# Altium footprint library Connectors.PcbLib: 164 footprints (part 3 of 11)
Each footprint in its own frame and in the unit in brackets; x right, y up, seen from the top. Pads: shape width x height; smd on the part's side, far side on the other; paste and mask are expansions set on the pad; w line width, h text height; cw(c..) or ccw(c..) is an arc to the next point about the centre after c.
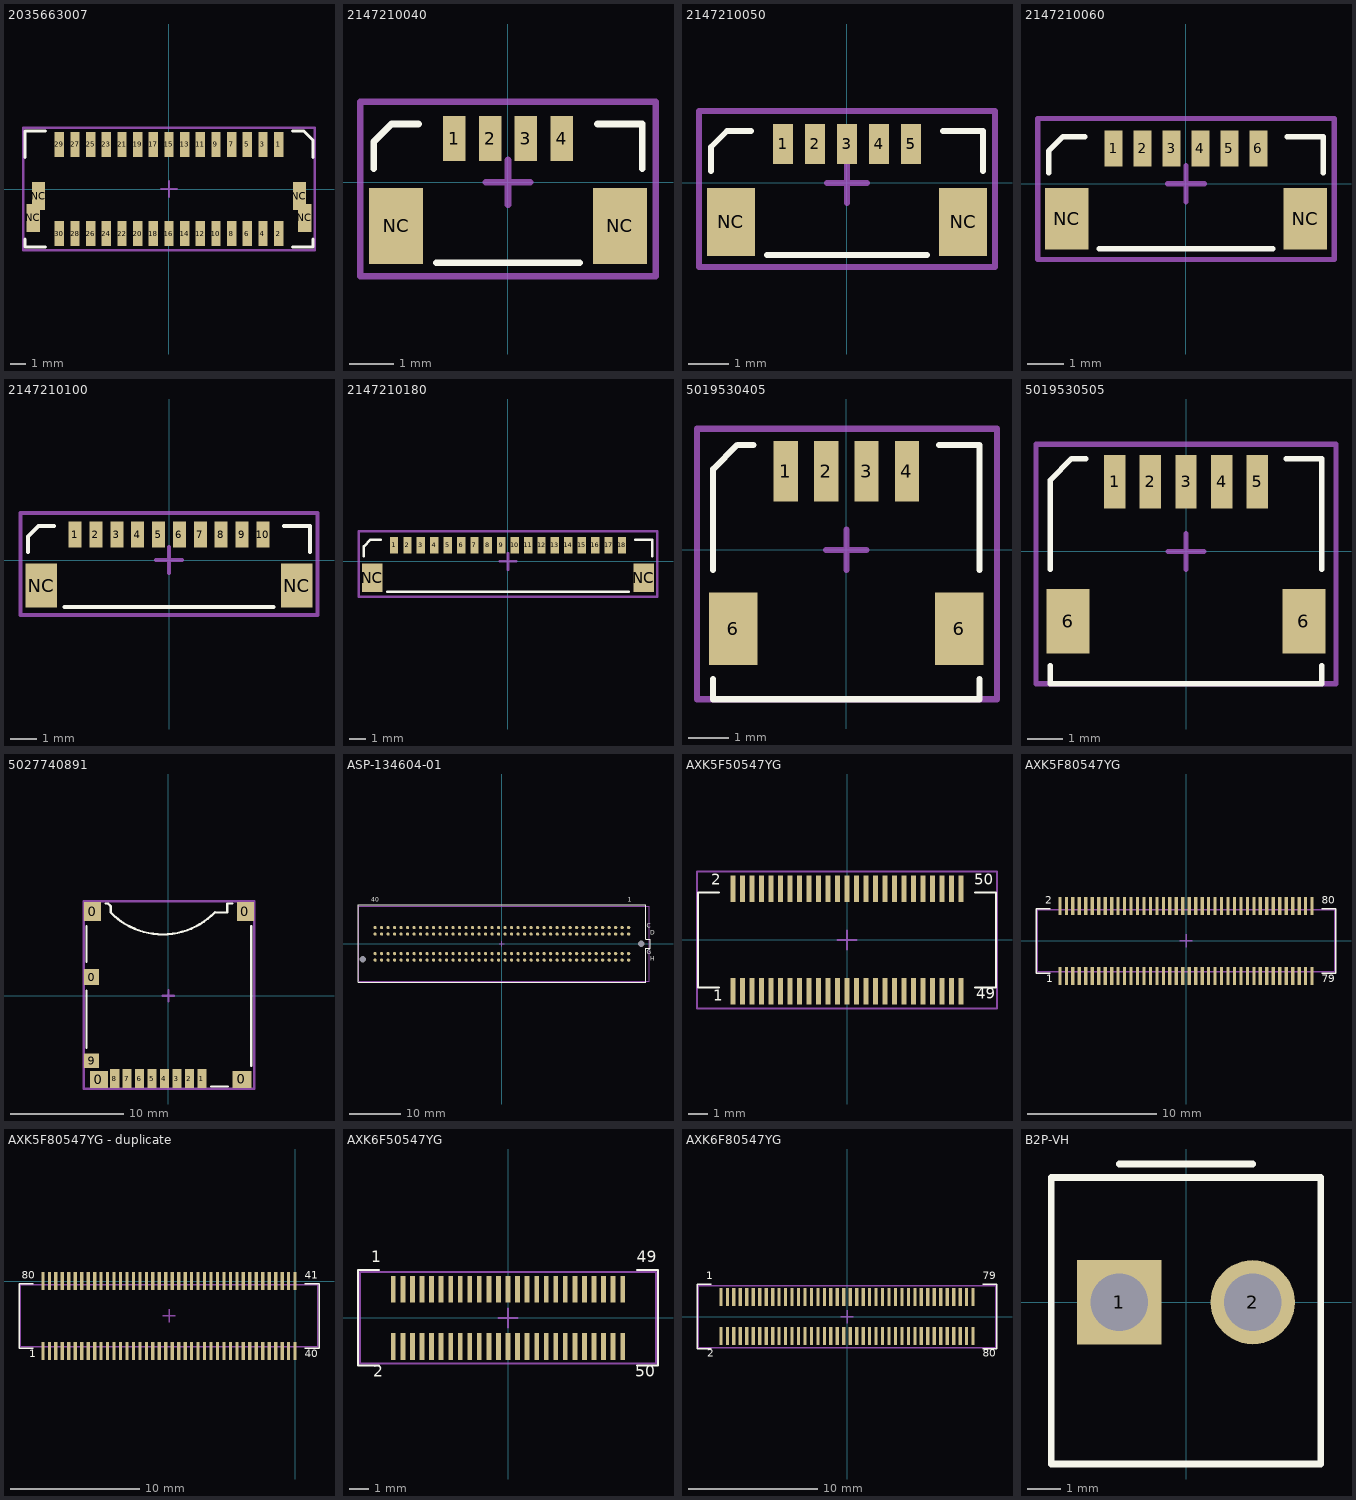
[diagram p2: the footprints below, top view; thin cyan lines are the x and y axes]

## 2035663007 [mm]
pads (34):
  rect 0.6x1.6 smd: 1(7,2.85) 2(7,-2.85) 3(6,2.85) 4(6,-2.85) 5(5,2.85) 6(5,-2.85) 7(4,2.85) 8(4,-2.85) 9(3,2.85) 10(3,-2.85) 11(2,2.85) 12(2,-2.85) 13(1,2.85) 14(1,-2.85) 15(0,2.85) 16(0,-2.85) 17(-1,2.85) 18(-1,-2.85) 19(-2,2.85) 20(-2,-2.85) 21(-3,2.85) 22(-3,-2.85) 23(-4,2.85) 24(-4,-2.85) 25(-5,2.85) 26(-5,-2.85) 27(-6,2.85) 28(-6,-2.85) 29(-7,2.85) 30(-7,-2.85)
  rect 0.85x1.8 smd: NC(-8.675,-1.85) NC(-8.325,-0.45) NC(8.325,-0.45) NC(8.675,-1.85)
Top Overlay:
  lines w0.2: -9.2,-3.2 -9.2,-3.7 -7.9,-3.7 ; -9.2,2 -9.2,3.7 -7.9,3.7 ; 7.9,-3.7 9.2,-3.7 9.2,-3.2 ; 7.9,3.7 8.6,3.7 9.2,3.1 9.2,2
Mechanical 15:
  lines w0.15: -0.5,0 0.5,0 ; 0,-0.5 0,0.5 ; -9.3,-3.9 9.3,-3.9 9.3,3.9 -9.3,3.9 -9.3,-3.9
3D body "2035663007.stp": height 8.23, standoff -0.03, extent -9,-3 9,3.5

## 2147210040 [mm]
height 1.6
pads (6):
  rect 0.5x1 smd: 1(-1.2,0.975) 2(-0.4,0.975) 3(0.4,0.975) 4(1.2,0.975)
  rect 1.2x1.7 smd: NC(-2.5,-0.975) NC(2.5,-0.975)
Top Overlay:
  lines w0.15: -3,0.3 -3,0.9 -2.6,1.3 -2,1.3 ; -1.6,-1.8 1.6,-1.8 ; 2,1.3 3,1.3 3,0.3
Mechanical 13:
  lines w0.15: -0.5,0 0.5,0 ; 0,-0.5 0,0.5 ; -3.3,-2.1 -3.3,1.8 3.3,1.8 3.3,-2.1 -3.3,-2.1
3D body "2147210040.stp": height 1.6, standoff 0, extent -2.74,-1.5 2.74,1

## 2147210050 [mm]
height 1.6
pads (7):
  rect 0.5x1 smd: 1(-1.6,0.975) 2(-0.8,0.975) 3(0,0.975) 4(0.8,0.975) 5(1.6,0.975)
  rect 1.2x1.7 smd: NC(-2.9,-0.975) NC(2.9,-0.975)
Top Overlay:
  lines w0.15: -3.4,0.3 -3.4,0.9 -3,1.3 -2.4,1.3 ; -2,-1.8 2,-1.8 ; 2.4,1.3 3.4,1.3 3.4,0.3
Mechanical 13:
  lines w0.15: -0.5,0 0.5,0 ; 0,-0.5 0,0.5 ; -3.7,-2.1 -3.7,1.8 3.7,1.8 3.7,-2.1 -3.7,-2.1
3D body "2147210050.stp": height 1.55, standoff -0.05, extent -3.14,-1.5 3.14,1

## 2147210060 [mm]
height 1.6
pads (8):
  rect 0.5x1 smd: 1(-2,0.975) 2(-1.2,0.975) 3(-0.4,0.975) 4(0.4,0.975) 5(1.2,0.975) 6(2,0.975)
  rect 1.2x1.7 smd: NC(-3.3,-0.975) NC(3.3,-0.975)
Top Overlay:
  lines w0.15: -3.8,0.3 -3.8,0.9 -3.4,1.3 -2.8,1.3 ; -2.4,-1.8 2.4,-1.8 ; 2.8,1.3 3.8,1.3 3.8,0.3
Mechanical 13:
  lines w0.15: -0.5,0 0.5,0 ; 0,-0.5 0,0.5 ; -4.1,-2.1 -4.1,1.8 4.1,1.8 4.1,-2.1 -4.1,-2.1
3D body "2147210060.stp": height 1.6, standoff 0, extent -3.54,-1.5 3.54,1

## 2147210100 [mm]
height 1.6
pads (12):
  rect 0.5x1 smd: 1(-3.6,0.975) 2(-2.8,0.975) 3(-2,0.975) 4(-1.2,0.975) 5(-0.4,0.975) 6(0.4,0.975) 7(1.2,0.975) 8(2,0.975) 9(2.8,0.975) 10(3.6,0.975)
  rect 1.2x1.7 smd: NC(-4.9,-0.975) NC(4.9,-0.975)
Top Overlay:
  lines w0.15: -5.4,0.3 -5.4,0.9 -5,1.3 -4.4,1.3 ; -4,-1.8 4,-1.8 ; 4.4,1.3 5.4,1.3 5.4,0.3
Mechanical 13:
  lines w0.15: -0.5,0 0.5,0 ; 0,-0.5 0,0.5 ; -5.7,-2.1 5.7,-2.1 5.7,1.8 -5.7,1.8 -5.7,-2.1
3D body "2147210100.stp": height 1.6, standoff 0, extent -5.14,-1.5 5.14,1

## 2147210180 [mm]
height 1.6
pads (20):
  rect 0.5x1 smd: 1(-6.8,0.975) 2(-6,0.975) 3(-5.2,0.975) 4(-4.4,0.975) 5(-3.6,0.975) 6(-2.8,0.975) 7(-2,0.975) 8(-1.2,0.975) 9(-0.4,0.975) 10(0.4,0.975) 11(1.2,0.975) 12(2,0.975) 13(2.8,0.975) 14(3.6,0.975) 15(4.4,0.975) 16(5.2,0.975) 17(6,0.975) 18(6.8,0.975)
  rect 1.2x1.7 smd: NC(-8.1,-0.975) NC(8.1,-0.975)
Top Overlay:
  lines w0.15: -8.6,0.3 -8.6,0.9 -8.2,1.3 -7.6,1.3 ; -7.2,-1.8 7.2,-1.8 ; 7.6,1.3 8.6,1.3 8.6,0.3
Mechanical 13:
  lines w0.15: -0.5,0 0.5,0 ; 0,-0.5 0,0.5 ; -8.9,-2.1 8.9,-2.1 8.9,1.8 -8.9,1.8 -8.9,-2.1
3D body "2147210180.stp": height 1.6, standoff 0, extent -8.34,-1.5 8.34,1

## 5019530405 [mm]
pads (6):
  rect 0.6x1.5 smd: 1(-1.5,1.95) 2(-0.5,1.95) 3(0.5,1.95) 4(1.5,1.95)
  rect 1.2x1.8 smd: 6(-2.8,-1.95) 6(2.8,-1.95)
Top Overlay:
  lines w0.15: -3.3,-3.2 -3.3,-3.7 3.3,-3.7 3.3,-3.2 ; -3.3,-0.5 -3.3,2 -2.7,2.6 -2.3,2.6 ; 2.3,2.6 3.3,2.6 3.3,-0.5
Mechanical 15:
  lines w0.15: -0.5,0 0.5,0 ; 0,-0.5 0,0.5 ; -3.7,-3.7 3.73,-3.7 3.73,3 -3.7,3 -3.7,-3.7
3D body "5019530405.stp": height 4.7, standoff 0, extent -3,-3.5 3,2.4

## 5019530505 [mm]
pads (7):
  rect 0.6x1.5 smd: 1(-2,1.95) 2(-1,1.95) 3(0,1.95) 4(1,1.95) 5(2,1.95)
  rect 1.2x1.8 smd: 6(-3.3,-1.95) 6(3.3,-1.95)
Top Overlay:
  lines w0.15: -3.8,-3.2 -3.8,-3.7 3.8,-3.7 3.8,-3.2 ; -3.8,-0.5 -3.8,2 -3.2,2.6 -2.8,2.6 ; 2.8,2.6 3.8,2.6 3.8,-0.5
Mechanical 15:
  lines w0.15: -0.5,0 0.5,0 ; 0,-0.5 0,0.5 ; -4.2,-3.7 4.2,-3.7 4.2,3 -4.2,3 -4.2,-3.7
3D body "5019530505.stp": height 4.7, standoff 0, extent -3.5,-3.5 3.5,2.4

## 5027740891 [mm]
pads (14):
  rect 1.29x1.4 smd: 0(-6.802,1.639)
  rect 1.5x1.7 smd: 0(-6.697,7.439) 0(6.803,7.439)
  rect 1.6x1.5 smd: 0(-6.147,-7.438)
  rect 1.7x1.5 smd: 0(6.503,-7.411)
  rect 0.8x1.68 smd: 1(2.953,-7.353) 2(1.853,-7.353) 3(0.753,-7.353) 4(-0.347,-7.353) 5(-1.447,-7.353) 6(-2.547,-7.353) 7(-3.647,-7.353) 8(-4.747,-7.353)
  rect 1.29x1.3 smd: 9(-6.802,-5.761)
Top Overlay:
  lines w0.2: -7.25,-4.6 -7.25,0.45 ; -7.25,3 -7.25,6.15 ; -5.55,8.15 -5.35,8.15 -5.2,8 -5.1,7.9 -5.1,7.35 ccw(c-0.5,11.85) 4.124,7.375 ; 3.8,-8.05 5.25,-8.05 ; 4.15,7.35 5.2,7.35 5.2,8.15 5.65,8.15 ; 7.33,-6.208 7.33,6.15
Mechanical 15:
  lines w0.2: -0.5,0 0.5,0 ; 0,-0.5 0,0.5 ; -7.5,-8.25 7.35,-8.25 7.6,-8.25 7.6,8.35 -7.5,8.35 -7.5,-8.25
3D body "5027740891.stp": height 1.78, standoff -0.02, extent -7.102,-7.968 7.198,8.032

## ASP-134604-01 [mm]
pads (162):
  round 0.64 smd: C1(24.765,3.175) C2(23.495,3.175) C3(22.225,3.175) C4(20.955,3.175) C5(19.685,3.175) C6(18.415,3.175) C7(17.145,3.175) C8(15.875,3.175) C9(14.605,3.175) C10(13.335,3.175) C11(12.065,3.175) C12(10.795,3.175) C13(9.525,3.175) C14(8.255,3.175) C15(6.985,3.175) C16(5.715,3.175) C17(4.445,3.175) C18(3.175,3.175) C19(1.905,3.175) C20(0.635,3.175) C21(-0.635,3.175) C22(-1.905,3.175) C23(-3.175,3.175) C24(-4.445,3.175) C25(-5.715,3.175) C26(-6.985,3.175) C27(-8.255,3.175) C28(-9.525,3.175) C29(-10.795,3.175) C30(-12.065,3.175) C31(-13.335,3.175) C32(-14.605,3.175) C33(-15.875,3.175) C34(-17.145,3.175) C35(-18.415,3.175) C36(-19.685,3.175) C37(-20.955,3.175) C38(-22.225,3.175) C39(-23.495,3.175) C40(-24.765,3.175) D1(24.765,1.905) D2(23.495,1.905) D3(22.225,1.905) D4(20.955,1.905) D5(19.685,1.905) D6(18.415,1.905) D7(17.145,1.905) D8(15.875,1.905) D9(14.605,1.905) D10(13.335,1.905) D11(12.065,1.905) D12(10.795,1.905) D13(9.525,1.905) D14(8.255,1.905) D15(6.985,1.905) D16(5.715,1.905) D17(4.445,1.905) D18(3.175,1.905) D19(1.905,1.905) D20(0.635,1.905) D21(-0.635,1.905) D22(-1.905,1.905) D23(-3.175,1.905) D24(-4.445,1.905) D25(-5.715,1.905) D26(-6.985,1.905) D27(-8.255,1.905) D28(-9.525,1.905) D29(-10.795,1.905) D30(-12.065,1.905) D31(-13.335,1.905) D32(-14.605,1.905) D33(-15.875,1.905) D34(-17.145,1.905) D35(-18.415,1.905) D36(-19.685,1.905) D37(-20.955,1.905) D38(-22.225,1.905) D39(-23.495,1.905) D40(-24.765,1.905) G1(24.765,-1.905) G2(23.495,-1.905) G3(22.225,-1.905) G4(20.955,-1.905) G5(19.685,-1.905) G6(18.415,-1.905) G7(17.145,-1.905) G8(15.875,-1.905) G9(14.605,-1.905) G10(13.335,-1.905) G11(12.065,-1.905) G12(10.795,-1.905) G13(9.525,-1.905) G14(8.255,-1.905) G15(6.985,-1.905) G16(5.715,-1.905) G17(4.445,-1.905) G18(3.175,-1.905) G19(1.905,-1.905) G20(0.635,-1.905) G21(-0.635,-1.905) G22(-1.905,-1.905) G23(-3.175,-1.905) G24(-4.445,-1.905) G25(-5.715,-1.905) G26(-6.985,-1.905) G27(-8.255,-1.905) G28(-9.525,-1.905) G29(-10.795,-1.905) G30(-12.065,-1.905) G31(-13.335,-1.905) G32(-14.605,-1.905) G33(-15.875,-1.905) G34(-17.145,-1.905) G35(-18.415,-1.905) G36(-19.685,-1.905) G37(-20.955,-1.905) G38(-22.225,-1.905) G39(-23.495,-1.905) G40(-24.765,-1.905) H1(24.765,-3.175) H2(23.495,-3.175) H3(22.225,-3.175) H4(20.955,-3.175) H5(19.685,-3.175) H6(18.415,-3.175) H7(17.145,-3.175) H8(15.875,-3.175) H9(14.605,-3.175) H10(13.335,-3.175) H11(12.065,-3.175) H12(10.795,-3.175) H13(9.525,-3.175) H14(8.255,-3.175) H15(6.985,-3.175) H16(5.715,-3.175) H17(4.445,-3.175) H18(3.175,-3.175) H19(1.905,-3.175) H20(0.635,-3.175) H21(-0.635,-3.175) H22(-1.905,-3.175) H23(-3.175,-3.175) H24(-4.445,-3.175) H25(-5.715,-3.175) H26(-6.985,-3.175) H27(-8.255,-3.175) H28(-9.525,-3.175) H29(-10.795,-3.175) H30(-12.065,-3.175) H31(-13.335,-3.175) H32(-14.605,-3.175) H33(-15.875,-3.175) H34(-17.145,-3.175) H35(-18.415,-3.175) H36(-19.685,-3.175) H37(-20.955,-3.175) H38(-22.225,-3.175) H39(-23.495,-3.175) H40(-24.765,-3.175)
  round 0 hole 1.27 unplated: TH(-27.191,-3.05) TH1(27.189,0)
Top Overlay:
  lines w0.15: -28.1,-7.5 28.1,-7.5 28.1,-0.9 29,-0.9 29,0.9 28.1,0.9 28.1,7.6 -28.1,7.6 -28.1,-7.5
  text "H" at 29,-3.6 h1.5
  text "G" at 28.3,-2.3 h1.5
  text "D" at 29,1.5 h1.5
  text "C" at 28.3,2.9 h1.5
  text "40" at -25.499,7.9 h1.5
  text "1" at 24.6,7.9 h1.5
Mechanical 13:
  lines w0.15: -0.5,0 0.5,0 ; 0,-0.5 0,0.5 ; -28,-7.3 28.8,-7.3 28.8,7.3 -28,7.3 -28,-7.3
3D body "User Library-ASP-134604-01-1.step": height 7.48, standoff -0.91, extent -27.889,-7.341 28.778,7.341

## AXK5F50547YG [mm] "Socket (Mated height: 2.5 mm)"
height 1.85
pads (50):
  rect 0.25x1.4 smd: 1(-6,-2.7) 2(-6,2.7) 3(-5.5,-2.7) 4(-5.5,2.7) 5(-5,-2.7) 6(-5,2.7) 7(-4.5,-2.7) 8(-4.5,2.7) 9(-4,-2.7) 10(-4,2.7) 11(-3.5,-2.7) 12(-3.5,2.7) 13(-3,-2.7) 14(-3,2.7) 15(-2.5,-2.7) 16(-2.5,2.7) 17(-2,-2.7) 18(-2,2.7) 19(-1.5,-2.7) 20(-1.5,2.7) 21(-1,-2.7) 22(-1,2.7) 23(-0.5,-2.7) 24(-0.5,2.7) 25(0,-2.7) 26(0,2.7) 27(0.5,-2.7) 28(0.5,2.7) 29(1,-2.7) 30(1,2.7) 31(1.5,-2.7) 32(1.5,2.7) 33(2,-2.7) 34(2,2.7) 35(2.5,-2.7) 36(2.5,2.7) 37(3,-2.7) 38(3,2.7) 39(3.5,-2.7) 40(3.5,2.7) 41(4,-2.7) 42(4,2.7) 43(4.5,-2.7) 44(4.5,2.7) 45(5,-2.7) 46(5,2.7) 47(5.5,-2.7) 48(5.5,2.7) 49(6,-2.7) 50(6,2.7)
Top Overlay:
  lines w0.1: -6.75,-2.5 -7.85,-2.5 -7.85,2.5 -6.75,2.5 ; 6.75,-2.5 7.85,-2.5 7.85,2.5 6.75,2.5
  text "2" at -7.15,2.7 h1
  text "1" at -7.05,-3.4 h1
  text "49" at 6.8,-3.3 h1
  text "50" at 6.7,2.7 h1
Mechanical 15:
  lines w0.1: -0.5,0 0.5,0 ; 0,-0.5 0,0.5 ; -7.9,-3.6 -7.9,3.6 7.9,3.6 7.9,-3.6 -7.9,-3.6
3D body "axk5f50547y.stp": height 1.85, standoff 0, extent -7.75,-2.9 7.75,2.9

## AXK5F80547YG [mm] "Socket (Mated height: 1.5 mm, 2.0 mm, 2.5 mm)"
height 1.85
pads (80):
  rect 0.25x1.4 smd: 1(-9.75,-2.7) 2(-9.75,2.7) 3(-9.25,-2.7) 4(-9.25,2.7) 5(-8.75,-2.7) 6(-8.75,2.7) 7(-8.25,-2.7) 8(-8.25,2.7) 9(-7.75,-2.7) 10(-7.75,2.7) 11(-7.25,-2.7) 12(-7.25,2.7) 13(-6.75,-2.7) 14(-6.75,2.7) 15(-6.25,-2.7) 16(-6.25,2.7) 17(-5.75,-2.7) 18(-5.75,2.7) 19(-5.25,-2.7) 20(-5.25,2.7) 21(-4.75,-2.7) 22(-4.75,2.7) 23(-4.25,-2.7) 24(-4.25,2.7) 25(-3.75,-2.7) 26(-3.75,2.7) 27(-3.25,-2.7) 28(-3.25,2.7) 29(-2.75,-2.7) 30(-2.75,2.7) 31(-2.25,-2.7) 32(-2.25,2.7) 33(-1.75,-2.7) 34(-1.75,2.7) 35(-1.25,-2.7) 36(-1.25,2.7) 37(-0.75,-2.7) 38(-0.75,2.7) 39(-0.25,-2.7) 40(-0.25,2.7) 41(0.25,-2.7) 42(0.25,2.7) 43(0.75,-2.7) 44(0.75,2.7) 45(1.25,-2.7) 46(1.25,2.7) 47(1.75,-2.7) 48(1.75,2.7) 49(2.25,-2.7) 50(2.25,2.7) 51(2.75,-2.7) 52(2.75,2.7) 53(3.25,-2.7) 54(3.25,2.7) 55(3.75,-2.7) 56(3.75,2.7) 57(4.25,-2.7) 58(4.25,2.7) 59(4.75,-2.7) 60(4.75,2.7) 61(5.25,-2.7) 62(5.25,2.7) 63(5.75,-2.7) 64(5.75,2.7) 65(6.25,-2.7) 66(6.25,2.7) 67(6.75,-2.7) 68(6.75,2.7) 69(7.25,-2.7) 70(7.25,2.7) 71(7.75,-2.7) 72(7.75,2.7) 73(8.25,-2.7) 74(8.25,2.7) 75(8.75,-2.7) 76(8.75,2.7) 77(9.25,-2.7) 78(9.25,2.7) 79(9.75,-2.7) 80(9.75,2.7)
Top Overlay:
  lines w0.1: -10.5,-2.5 -11.6,-2.5 -11.6,2.5 -10.5,2.5 ; 10.5,-2.5 11.6,-2.5 11.6,2.5 10.5,2.5
  text "2" at -10.9,2.7 h1
  text "1" at -10.8,-3.4 h1
  text "80" at 10.5,2.7 h1
  text "79" at 10.5,-3.4 h1
Mechanical 15:
  lines w0.1: -0.5,0 0.5,0 ; 0,-0.5 0,0.5 ; -11.5,-2.4 -11.5,2.4 11.5,2.4 11.5,-2.4 -11.5,-2.4
3D body "axk5f80547y.stp": height 1.85, standoff 0, extent -11.5,-2.9 11.5,2.9

## AXK5F80547YG - duplicate [mm] "Socket (Mated height: 1.5 mm, 2.0 mm, 2.5 mm)"
height 1.85
pads (80):
  rect 0.25x1.4 smd: 1(-19.5,-5.4) 2(-19,-5.4) 3(-18.5,-5.4) 4(-18,-5.4) 5(-17.5,-5.4) 6(-17,-5.4) 7(-16.5,-5.4) 8(-16,-5.4) 9(-15.5,-5.4) 10(-15,-5.4) 11(-14.5,-5.4) 12(-14,-5.4) 13(-13.5,-5.4) 14(-13,-5.4) 15(-12.5,-5.4) 16(-12,-5.4) 17(-11.5,-5.4) 18(-11,-5.4) 19(-10.5,-5.4) 20(-10,-5.4) 21(-9.5,-5.4) 22(-9,-5.4) 23(-8.5,-5.4) 24(-8,-5.4) 25(-7.5,-5.4) 26(-7,-5.4) 27(-6.5,-5.4) 28(-6,-5.4) 29(-5.5,-5.4) 30(-5,-5.4) 31(-4.5,-5.4) 32(-4,-5.4) 33(-3.5,-5.4) 34(-3,-5.4) 35(-2.5,-5.4) 36(-2,-5.4) 37(-1.5,-5.4) 38(-1,-5.4) 39(-0.5,-5.4) 40(0,-5.4) 41(0,0) 42(-0.5,0) 43(-1,0) 44(-1.5,0) 45(-2,0) 46(-2.5,0) 47(-3,0) 48(-3.5,0) 49(-4,0) 50(-4.5,0) 51(-5,0) 52(-5.5,0) 53(-6,0) 54(-6.5,0) 55(-7,0) 56(-7.5,0) 57(-8,0) 58(-8.5,0) 59(-9,0) 60(-9.5,0) 61(-10,0) 62(-10.5,0) 63(-11,0) 64(-11.5,0) 65(-12,0) 66(-12.5,0) 67(-13,0) 68(-13.5,0) 69(-14,0) 70(-14.5,0) 71(-15,0) 72(-15.5,0) 73(-16,0) 74(-16.5,0) 75(-17,0) 76(-17.5,0) 77(-18,0) 78(-18.5,0) 79(-19,0) 80(-19.5,0)
Top Overlay:
  lines w0.1: -20.25,-5.2 -21.35,-5.2 -21.35,-0.2 -20.25,-0.2 ; 0.75,-5.2 1.85,-5.2 1.85,-0.2 0.75,-0.2
  text "40" at 0.75,-6.1 h1
  text "41" at 0.75,0 h1
  text "1" at -20.55,-6.1 h1
  text "80" at -21.15,0 h1
Mechanical 13:
  lines w0.1: -10.25,-2.7 -9.25,-2.7 ; -9.75,-3.2 -9.75,-2.2
Mechanical 15:
  lines w0.1: -21.25,-5.1 1.75,-5.1 1.75,-0.3 -21.25,-0.3 -21.25,-5.1
3D body "axk5f80547y.stp": height 1.85, standoff 0, extent -21.25,-5.6 1.75,0.2

## AXK6F50547YG [mm] "Socket (Mated height: 2.5 mm)"
height 2.5
pads (50):
  rect 0.25x1.4 smd: 1(-6,1.5) 2(-6,-1.5) 3(-5.5,1.5) 4(-5.5,-1.5) 5(-5,1.5) 6(-5,-1.5) 7(-4.5,1.5) 8(-4.5,-1.5) 9(-4,1.5) 10(-4,-1.5) 11(-3.5,1.5) 12(-3.5,-1.5) 13(-3,1.5) 14(-3,-1.5) 15(-2.5,1.5) 16(-2.5,-1.5) 17(-2,1.5) 18(-2,-1.5) 19(-1.5,1.5) 20(-1.5,-1.5) 21(-1,1.5) 22(-1,-1.5) 23(-0.5,1.5) 24(-0.5,-1.5) 25(0,1.5) 26(0,-1.5) 27(0.5,1.5) 28(0.5,-1.5) 29(1,1.5) 30(1,-1.5) 31(1.5,1.5) 32(1.5,-1.5) 33(2,1.5) 34(2,-1.5) 35(2.5,1.5) 36(2.5,-1.5) 37(3,1.5) 38(3,-1.5) 39(3.5,1.5) 40(3.5,-1.5) 41(4,1.5) 42(4,-1.5) 43(4.5,1.5) 44(4.5,-1.5) 45(5,1.5) 46(5,-1.5) 47(5.5,1.5) 48(5.5,-1.5) 49(6,1.5) 50(6,-1.5)
Top Overlay:
  lines w0.1: -6.75,-2.5 -7.85,-2.5 -7.85,2.5 -6.75,2.5 ; 6.75,-2.5 7.85,-2.5 7.85,2.5 6.75,2.5
  text "1" at -7.15,2.7 h1
  text "2" at -7.05,-3.3 h1
  text "49" at 6.75,2.7 h1
  text "50" at 6.65,-3.3 h1
Mechanical 15:
  lines w0.1: -0.5,0 0.5,0 ; 0,-0.5 0,0.5 ; -7.75,-2.4 7.75,-2.4 7.75,2.4 -7.75,2.4 -7.75,-2.4
3D body "axk6f50547y.stp": height 1.75, standoff 0, extent -7.75,-1.65 7.75,1.65

## AXK6F80547YG [mm] "Socket (Mated height: 23 mm, 3.3 mm, 2.5 mm)"
height 2.5
pads (80):
  rect 0.25x1.4 smd: 1(-9.75,1.5) 2(-9.75,-1.5) 3(-9.25,1.5) 4(-9.25,-1.5) 5(-8.75,1.5) 6(-8.75,-1.5) 7(-8.25,1.5) 8(-8.25,-1.5) 9(-7.75,1.5) 10(-7.75,-1.5) 11(-7.25,1.5) 12(-7.25,-1.5) 13(-6.75,1.5) 14(-6.75,-1.5) 15(-6.25,1.5) 16(-6.25,-1.5) 17(-5.75,1.5) 18(-5.75,-1.5) 19(-5.25,1.5) 20(-5.25,-1.5) 21(-4.75,1.5) 22(-4.75,-1.5) 23(-4.25,1.5) 24(-4.25,-1.5) 25(-3.75,1.5) 26(-3.75,-1.5) 27(-3.25,1.5) 28(-3.25,-1.5) 29(-2.75,1.5) 30(-2.75,-1.5) 31(-2.25,1.5) 32(-2.25,-1.5) 33(-1.75,1.5) 34(-1.75,-1.5) 35(-1.25,1.5) 36(-1.25,-1.5) 37(-0.75,1.5) 38(-0.75,-1.5) 39(-0.25,1.5) 40(-0.25,-1.5) 41(0.25,1.5) 42(0.25,-1.5) 43(0.75,1.5) 44(0.75,-1.5) 45(1.25,1.5) 46(1.25,-1.5) 47(1.75,1.5) 48(1.75,-1.5) 49(2.25,1.5) 50(2.25,-1.5) 51(2.75,1.5) 52(2.75,-1.5) 53(3.25,1.5) 54(3.25,-1.5) 55(3.75,1.5) 56(3.75,-1.5) 57(4.25,1.5) 58(4.25,-1.5) 59(4.75,1.5) 60(4.75,-1.5) 61(5.25,1.5) 62(5.25,-1.5) 63(5.75,1.5) 64(5.75,-1.5) 65(6.25,1.5) 66(6.25,-1.5) 67(6.75,1.5) 68(6.75,-1.5) 69(7.25,1.5) 70(7.25,-1.5) 71(7.75,1.5) 72(7.75,-1.5) 73(8.25,1.5) 74(8.25,-1.5) 75(8.75,1.5) 76(8.75,-1.5) 77(9.25,1.5) 78(9.25,-1.5) 79(9.75,1.5) 80(9.75,-1.5)
Top Overlay:
  lines w0.1: -10.5,-2.5 -11.6,-2.5 -11.6,2.5 -10.5,2.5 ; 10.5,-2.5 11.6,-2.5 11.6,2.5 10.5,2.5
  text "2" at -10.8,-3.3 h1
  text "1" at -10.9,2.7 h1
  text "79" at 10.5,2.7 h1
  text "80" at 10.5,-3.3 h1
Mechanical 15:
  lines w0.1: -0.5,0 0.5,0 ; 0,-0.5 0,0.5 ; -11.5,-2.4 -11.5,2.4 11.5,2.4 11.5,-2.4 -11.5,-2.4
3D body "axk6f80547y.stp": height 1.75, standoff 0, extent -11.5,-1.65 11.5,1.65

## B2P-VH [mm]
height 11
pads (2):
  rect 2.5x2.5 hole 1.7: 1(-1.98,0)
  round 2.5 hole 1.7: 2(1.98,0)
Top Overlay:
  lines w0.2: -1.98,4.1 1.98,4.1 ; -4,-4.8 -4,3.7 4,3.7 4,-4.8 -4,-4.8
3D body "User Library-B2P-VH.STEP": height 10.9, standoff -3.7, extent -3.93,-4.65 3.93,3.85